# Altium footprint library HamedLib.PcbLib: 221 footprints (part 11 of 14)
Each footprint in its own frame and in the unit in brackets; x right, y up, seen from the top. Pads: shape width x height; smd on the part's side, far side on the other; paste and mask are expansions set on the pad; w line width, h text height; cw(c..) or ccw(c..) is an arc to the next point about the centre after c.
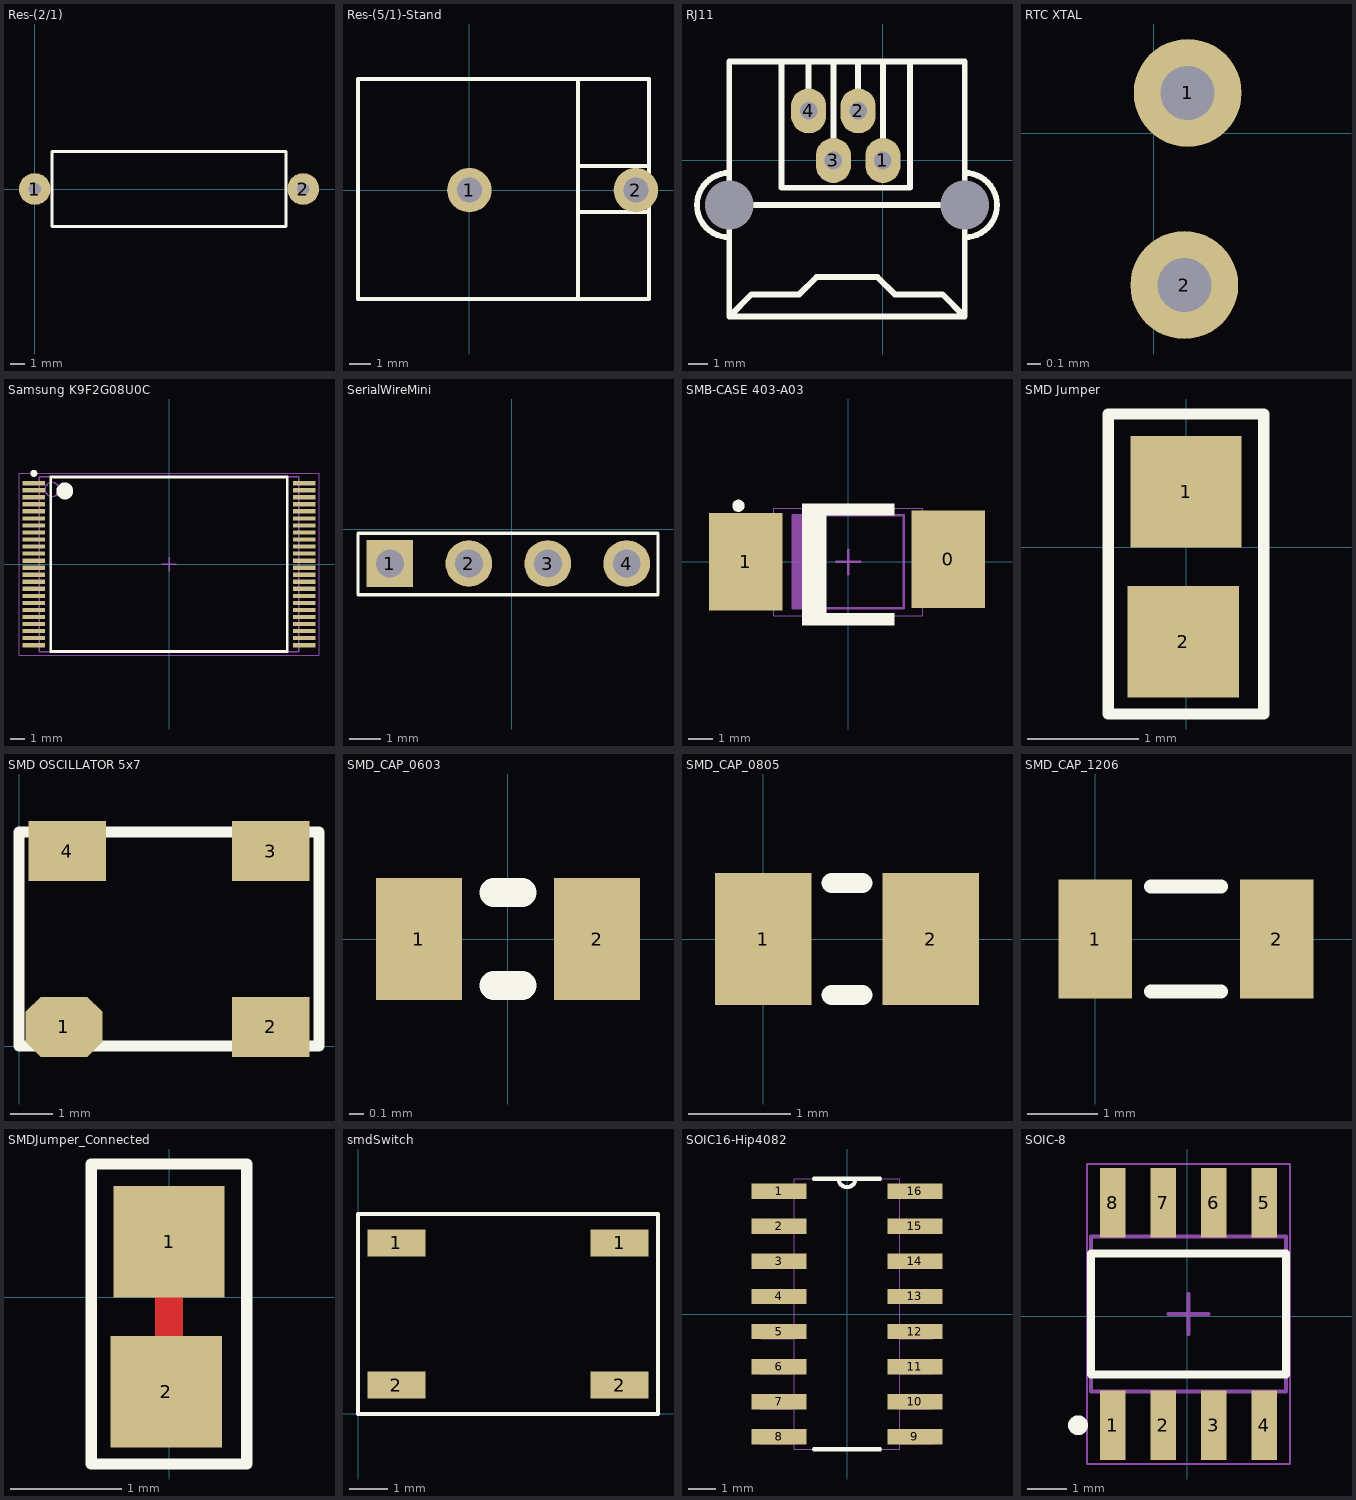
[diagram p10: the footprints below, top view; thin cyan lines are the x and y axes]

## Res-(2/1) [mm]
pads (2):
  round 2.2 hole 0.85: 1(0,0) 2(18.6,0)
Top Overlay:
  lines w0.2: 1.2,-2.6 17.4,-2.6 17.4,2.6 1.2,2.6 1.2,-2.6

## Res-(5/1)-Stand [mil]
pads (2):
  round 80 hole 45: 1(0,0) 2(300,0)
Top Overlay:
  lines w7: 195.69,-196 195.69,200 ; 195.69,-39.37 324,-39.37 ; 195.69,43.31 324,43.31 ; -200.79,-196 324,-196 324,200 -200.79,200 -200.79,-196
3D body "5W Res.STEP": height 907.48, standoff -94.49, extent -195.48,-194 319.48,199.7

## RJ11 [mm]
pads (6):
  oval 1.8x2.3 hole 0.9: 1(0,0) 2(-1.27,2.54) 3(-2.54,0) 4(-3.81,2.54)
  round 2 hole 2.5: ""(-7.874,-2.286) ""(4.191,-2.286)
Top Overlay:
  lines w0.3: -7.874,-3.937 cw(c-7.874,-2.286) -7.874,-0.635 ; 4.191,-3.937 ccw(c4.191,-2.286) 4.191,-0.635
  lines w0.305: -7.874,-2.286 4.191,-2.286 ; -5.207,4.953 -5.207,-1.397 1.397,-1.397 1.397,4.953 ; -3.81,2.921 -3.81,4.953 ; -2.54,0.381 -2.54,4.953 ; -1.27,2.921 -1.27,4.953 ; 0,0.381 0,5.08 ; -7.874,-8.001 -6.731,-6.858 -4.286,-6.858 -3.397,-5.969 -0.286,-5.969 0.603,-6.858 3.048,-6.858 4.191,-8.001 ; -7.874,-8.001 4.191,-8.001 ; -7.874,-8.001 -7.874,5.08 4.191,5.08 4.191,-8.001
3D body "User Library-RJ11-WE-HOR-TAB-UP.step": height 14.5, standoff -3.5, extent -9.075,-8.25 5.325,4.75

## RTC XTAL [mm]
pads (2):
  round 0.8 hole 0.4: 1(0.25,0.3) 2(0.225,-1.125)
3D body "User Library-DT-26-1.step": height 3, standoff -1, extent -6.765,-1.4 0.375,0.6

## Samsung K9F2G08U0C [mm] "Nand 2Gigbit Flash"
pads (48):
  rect 1.6x0.3 smd: 1(-9.6,5.75) 2(-9.6,5.25) 3(-9.6,4.75) 4(-9.6,4.25) 5(-9.6,3.75) 6(-9.6,3.25) 7(-9.6,2.75) 8(-9.6,2.25) 9(-9.6,1.75) 10(-9.6,1.25) 11(-9.6,0.75) 12(-9.6,0.25) 13(-9.6,-0.25) 14(-9.6,-0.75) 15(-9.6,-1.25) 16(-9.6,-1.75) 17(-9.6,-2.25) 18(-9.6,-2.75) 19(-9.6,-3.25) 20(-9.6,-3.75) 21(-9.6,-4.25) 22(-9.6,-4.75) 23(-9.6,-5.25) 24(-9.6,-5.75) 25(9.6,-5.75) 26(9.6,-5.25) 27(9.6,-4.75) 28(9.6,-4.25) 29(9.6,-3.75) 30(9.6,-3.25) 31(9.6,-2.75) 32(9.6,-2.25) 33(9.6,-1.75) 34(9.6,-1.25) 35(9.6,-0.75) 36(9.6,-0.25) 37(9.6,0.25) 38(9.6,0.75) 39(9.6,1.25) 40(9.6,1.75) 41(9.6,2.25) 42(9.6,2.75) 43(9.6,3.25) 44(9.6,3.75) 45(9.6,4.25) 46(9.6,4.75) 47(9.6,5.25) 48(9.6,5.75)
Top Overlay:
  circle w0.6: c-7.4,5.2 r0.3
  circle w0.25: c-9.6,6.45 r0.125
  lines w0.2: -8.4,-6.2 8.4,-6.2 8.4,6.2 -8.4,6.2 -8.4,-6.2
Mechanical 13:
  circle w0.1: c-8.3,5.3 r0.5
  lines w0.1: -9.2,-6.2 9.2,-6.2 9.2,6.2 -9.2,6.2 -9.2,-6.2
Mechanical 15:
  lines w0.05: -10.65,-6.45 10.65,-6.45 10.65,6.45 -10.65,6.45 -10.65,-6.45
  lines w0.1: -0.5,0 0.5,0 ; 0,-0.5 0,0.5
3D body "User Library-TSOP48-1.STEP": height 1.2, standoff 0, extent -10.125,-6.075 10.075,6.025

## SerialWireMini [mm]
pads (4):
  rect 1.5x1.5 hole 0.9: 1(-3.925,-1.097)
  round 1.5 hole 0.9: 2(-1.385,-1.097) 3(1.155,-1.097) 4(3.695,-1.097)
Top Overlay:
  lines w0.1: -4.95,-2.1 -4.95,-0.125 4.7,-0.125 4.7,-2.1 -4.95,-2.1

## SMB-CASE 403-A03 [mm] "Molded Diode,MURS120T"
height 2
pads (2):
  rect 3x4 smd: 0(4.1,0.1) 1(-4.2,0)
Top Overlay:
  circle w0.25: c-4.5,2.3 r0.125
  rectangle: -1.9,-2.6 -0.9,2.4
  rectangle: -1.3,-2.6 1.9,-2.1
  rectangle: -1.3,1.9 1.9,2.4
Mechanical 13:
  rectangle: -2.285,-1.905 -1.67,1.905
  lines w0.1: -2.285,-1.905 -2.285,1.905 2.285,1.905 2.285,-1.905 -2.285,-1.905
Mechanical 15:
  lines w0.05: -3.05,-2.2 -3.05,2.2 3.05,2.2 3.05,-2.2 -3.05,-2.2
  lines w0.1: -0.5,0 0.5,0 ; 0,-0.5 0,0.5
3D body: height 2, standoff 0, extent -2.285,-1.905 2.285,1.905
3D body "SMC CASE 403-03.STEP": height 2.2, standoff 0, extent -4.1,-2.975 3.9,2.975

## SMD Jumper [mm]
pads (2):
  rect 1x1 smd: 1(0,0.5) 2(-0.025,-0.85)
Top Overlay:
  lines w0.1: -0.7,1.2 0.7,1.2 0.7,-1.5 -0.7,-1.5 -0.7,1.2 ; -0.7,1.2 -0.7,1.2

## SMD OSCILLATOR 5x7 [mm]
height 1.4
pads (4):
  oct 1.8x1.4 smd: 1(1.05,0.45)
  rect 1.8x1.4 smd: 2(5.875,0.45) 3(5.875,4.55) 4(1.125,4.55)
Top Overlay:
  lines w0.254: 0,0 7,0 7,5 0,5 0,0
3D body "User Library-ECS-3951.step": height 1.7, standoff 0, extent 0,0 7,5.002

## SMD_CAP_0603 [mm]
pads (2):
  rect 0.6x0.85 smd: 1(-0.622,0) 2(0.622,0)
Top Overlay:
  lines w0.2: -0.1,-0.325 0.1,-0.325 ; -0.1,0.325 0.1,0.325
3D body "cap 0603.STEP": height 0.6, standoff 0, extent -0.762,-0.381 0.762,0.381

## SMD_CAP_0805 [mm]
pads (2):
  rect 0.95x1.3 smd: 1(0,0) 2(1.65,0)
Top Overlay:
  lines w0.2: 0.675,-0.55 0.975,-0.55 ; 0.675,0.55 0.975,0.55
3D body "cap 0805.STEP": height 0.65, standoff 0, extent -0.191,-0.635 1.841,0.635

## SMD_CAP_1206 [mm]
pads (2):
  rect 1.05x1.7 smd: 1(0,0) 2(2.596,0)
Top Overlay:
  lines w0.2: 0.798,-0.75 1.798,-0.75 ; 0.798,0.75 1.798,0.75
3D body "cap 1206.STEP": height 0.75, standoff 0, extent -0.224,-0.775 2.824,0.749

## SMDJumper_Connected [mm]
pads (2):
  rect 1x1 smd: 1(0,0.5) 2(-0.025,-0.85)
Top Layer:
  lines w0.254: 0,-0.508 0,0.5
Top Overlay:
  lines w0.1: -0.7,1.2 0.7,1.2 0.7,-1.5 -0.7,-1.5 -0.7,1.2 ; -0.7,1.2 -0.7,1.2

## smdSwitch [mm]
height 1.2
pads (4):
  rect 1.5x0.7 smd: 1(1,4.45) 1(6.8,4.45) 2(1,0.75) 2(6.8,0.75)
Top Overlay:
  lines w0.1: 0,0 7.8,0 7.8,5.2 0,5.2 0,0
3D body "User Library-IT-1187.STEP": height 1.5, standoff 0, extent 0.625,0 7.025,5.2

## SOIC16-Hip4082 [mil]
pads (16):
  rect 78x22 smd: 1(-97,175) 2(-97,125) 3(-97,75) 4(-97,25) 5(-97,-25) 6(-97,-75) 7(-97,-125) 8(-97,-175) 9(97,-175) 10(97,-125) 11(97,-75) 12(97,-25) 13(97,25) 14(97,75) 15(97,125) 16(97,175)
Top Overlay:
  lines w6: -47,-193 47,-193 ; -47,193 -12,193 ; 47,193 12,193 ; -12,193 ccw(c0,193) 12,193 ; -12,193 12,193
Mechanical 1:
  lines w0: -12,193 ccw(c0,193) 12,193 ; -12,193 -75,193 -75,-193 75,-193 75,193 12,193 ; -12,193 12,193 ; -122,-185 -75,-185 -75,-165 -122,-165 -122,-185 ; -122,-135 -75,-135 -75,-115 -122,-115 -122,-135 ; -122,-85 -75,-85 -75,-65 -122,-65 -122,-85 ; -122,-35 -75,-35 -75,-15 -122,-15 -122,-35 ; -122,15 -75,15 -75,35 -122,35 -122,15 ; -122,65 -75,65 -75,85 -122,85 -122,65 ; -122,115 -75,115 -75,135 -122,135 -122,115 ; -122,165 -75,165 -75,185 -122,185 -122,165 ; 75,-185 122,-185 122,-165 75,-165 75,-185 ; 75,-135 122,-135 122,-115 75,-115 75,-135 ; 75,-85 122,-85 122,-65 75,-65 75,-85 ; 75,-35 122,-35 122,-15 75,-15 75,-35 ; 75,15 122,15 122,35 75,35 75,15 ; 75,65 122,65 122,85 75,85 75,65 ; 75,115 122,115 122,135 75,135 75,115 ; 75,165 122,165 122,185 75,185 75,165

## SOIC-8 [mm]
pads (8):
  rect 0.65x1.75 smd: 1(-1.88,-2.749) 2(-0.61,-2.749) 3(0.66,-2.749) 4(1.93,-2.749) 5(1.93,2.851) 6(0.66,2.851) 7(-0.61,2.851) 8(-1.88,2.851)
Top Overlay:
  circle w0.25: c-2.755,-2.749 r0.125
  lines w0.2: -2.425,-1.474 2.475,-1.474 2.475,1.576 -2.425,1.576 -2.425,-1.474
Mechanical 13:
  lines w0.1: -2.425,-1.899 -2.425,2.001 2.475,2.001 2.475,-1.899 -2.425,-1.899
Mechanical 15:
  lines w0.05: -2.525,-3.724 2.575,-3.724 2.575,3.826 -2.525,3.826 -2.525,-3.724
  lines w0.1: -0.475,0.051 0.525,0.051 ; 0.025,-0.449 0.025,0.551
3D body "User Library-SOIC-8-1.step": height 1.75, standoff 0, extent -2.45,-2.771 2.45,3.229